# Altium integrated library Altium_WR-USB (rev21a).IntLib: 47 symbols
Pins are listed as number, name and electrical type; pins without a type are passive.

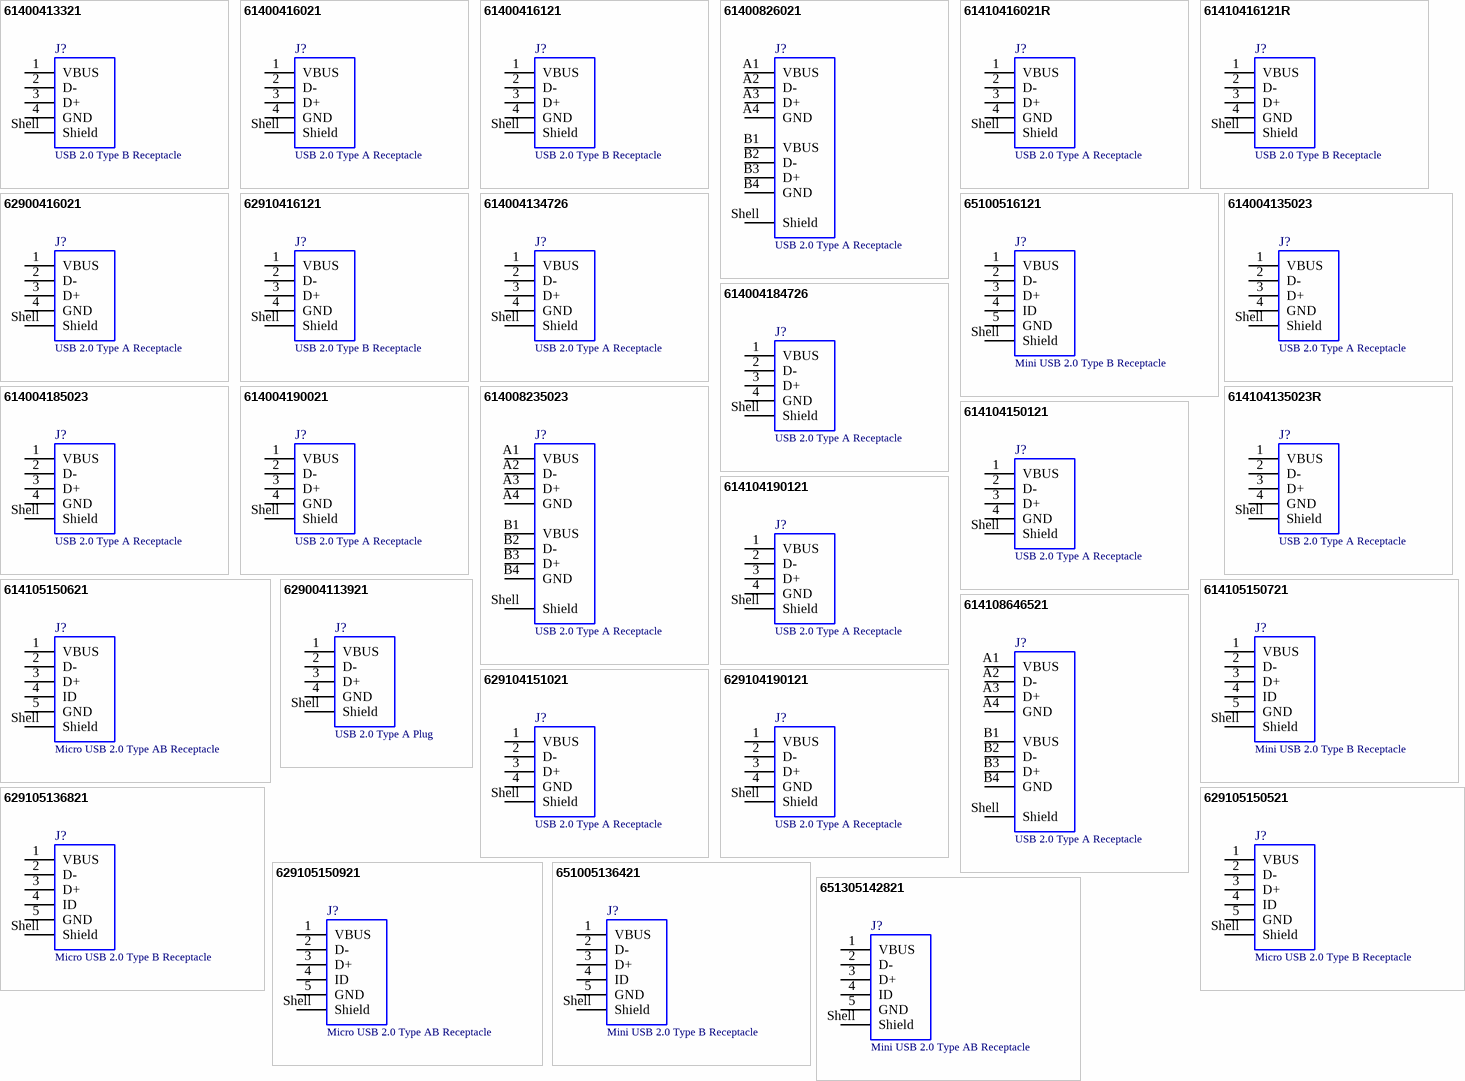
[diagram p0: symbols 61400413321 to 651305142821]

## 61400413321
designator J?, comment USB 2.0 Type B Receptacle
USB 2.0 Type B, Receptacle, Vertical, THT; Manufacturer: Wurth Elektronik; Manufacturer Part Number: 61400413321; Rated Current: 1.5A; Pin Number: 4; Interface Type: Type B; Working Voltage: 30VAC; ComponentLink1Description: Manufacturer; ComponentLink1URL: http://www.we-online.de; ComponentLink2Description: Datasheet; ComponentLink2URL: https://katalog.we-online.com/em/datasheet/61400413321.pdf; Published Date: August 2020; Gender: Receptacle; Type: Vertical; Packaging: Tray; Operating Temperature: -40 to +105degC; Mounting Technology: THT; Application: USB 2.0
footprint 61400413321
pins: 1 VBUS, 2 D-, 3 D+, 4 GND, Shell Shield

## 61400416021
designator J?, comment USB 2.0 Type A Receptacle
USB 2.0 Type A, Receptacle, Horizontal, THT; Manufacturer: Wurth Elektronik; Manufacturer Part Number: 61400416021; Rated Current: 1.5A; Pin Number: 4; Interface Type: Type A; Working Voltage: 30VAC; ComponentLink1Description: Manufacturer; ComponentLink1URL: http://www.we-online.de; ComponentLink2Description: Datasheet; ComponentLink2URL: https://katalog.we-online.com/em/datasheet/61400416021.pdf; Published Date: August 2020; Gender: Receptacle; Type: Horizontal; Packaging: Tray; Operating Temperature: -40 to +105degC; Mounting Technology: THT; Application: USB 2.0
footprint 61400416021
pins: 1 VBUS, 2 D-, 3 D+, 4 GND, Shell Shield

## 61400416121
designator J?, comment USB 2.0 Type B Receptacle
USB 2.0 Type B, Receptacle, Horizontal, THT; Manufacturer: Wurth Elektronik; Manufacturer Part Number: 61400416121; Rated Current: 1.5A; Pin Number: 4; Interface Type: Type B; Working Voltage: 30VAC; ComponentLink1Description: Manufacturer; ComponentLink1URL: http://www.we-online.de; ComponentLink2Description: Datasheet; ComponentLink2URL: https://katalog.we-online.com/em/datasheet/61400416121.pdf; Published Date: August 2020; Gender: Receptacle; Type: Horizontal; Packaging: Tray; Operating Temperature: -40 to +105degC; Mounting Technology: THT; Application: USB 2.0
footprint 61400416121
pins: 1 VBUS, 2 D-, 3 D+, 4 GND, Shell Shield

## 61400826021
designator J?, comment USB 2.0 Type A Receptacle
USB 2.0 Type A, Receptacle, Horizontal, THT, Dual Stacked; Manufacturer: Wurth Elektronik; Manufacturer Part Number: 61400826021; Rated Current: 1.5A; Pin Number: 8; Interface Type: Type A; Working Voltage: 30VAC; ComponentLink1Description: Manufacturer; ComponentLink1URL: http://www.we-online.de; ComponentLink2Description: Datasheet; ComponentLink2URL: https://katalog.we-online.com/em/datasheet/61400826021.pdf; Published Date: August 2020; Gender: Receptacle; Type: Horizontal; Packaging: Tray; Operating Temperature: -40 to +105degC; Mounting Technology: THT; Application: USB 2.0
footprint 61400826021
pins: A1 VBUS, A2 D-, A3 D+, A4 GND, B1 VBUS, B2 D-, B3 D+, B4 GND, Shell Shield

## 61410416021R
designator J?, comment USB 2.0 Type A Receptacle
USB 2.0 Type A, Receptacle, Horizontal, THR; Manufacturer: Wurth Elektronik; Manufacturer Part Number: 61410416021R; Rated Current: 1.5A; Pin Number: 4; Interface Type: Type A; Working Voltage: 30VAC; ComponentLink1Description: Manufacturer; ComponentLink1URL: http://www.we-online.de; ComponentLink2Description: Datasheet; ComponentLink2URL: https://katalog.we-online.com/em/datasheet/61410416021R.pdf; Published Date: August 2020; Gender: Receptacle; Type: Horizontal; Packaging: Tape and Reel; Operating Temperature: -55 to +85degC; Mounting Technology: THR; Application: USB 2.0
footprint 61410416021R
pins: 1 VBUS, 2 D-, 3 D+, 4 GND, Shell Shield

## 61410416121R
designator J?, comment USB 2.0 Type B Receptacle
USB 2.0 Type B, Receptacle, Horizontal, THR; Manufacturer: Wurth Elektronik; Manufacturer Part Number: 61410416121R; Rated Current: 1.5A; Pin Number: 4; Interface Type: Type B; Working Voltage: 30VAC; ComponentLink1Description: Manufacturer; ComponentLink1URL: http://www.we-online.de; ComponentLink2Description: Datasheet; ComponentLink2URL: https://katalog.we-online.com/em/datasheet/61410416121R.pdf; Published Date: August 2020; Gender: Receptacle; Type: Horizontal; Packaging: Tape and Reel; Operating Temperature: -55 to +85degC; Mounting Technology: THR; Application: USB 2.0
footprint 61410416121R
pins: 1 VBUS, 2 D-, 3 D+, 4 GND, Shell Shield

## 62900416021
designator J?, comment USB 2.0 Type A Receptacle
USB 2.0 Type A, Receptacle, Horizontal, SMT; Manufacturer: Wurth Elektronik; Manufacturer Part Number: 62900416021; Rated Current: 1.5A; Pin Number: 4; Interface Type: Type A; Working Voltage: 30VAC; ComponentLink1Description: Manufacturer; ComponentLink1URL: http://www.we-online.de; ComponentLink2Description: Datasheet; ComponentLink2URL: https://katalog.we-online.com/em/datasheet/62900416021.pdf; Published Date: August 2020; Gender: Receptacle; Type: Horizontal; Packaging: Tray; Operating Temperature: -40 to +105degC; Mounting Technology: SMT; Application: USB 2.0
footprint 62900416021
pins: 1 VBUS, 2 D-, 3 D+, 4 GND, Shell Shield

## 62910416121
designator J?, comment USB 2.0 Type B Receptacle
USB 2.0 Type B, Receptacle, Horizontal, SMT; Manufacturer: Wurth Elektronik; Manufacturer Part Number: 62910416121; Rated Current: 1.5A; Pin Number: 4; Interface Type: Type B; Working Voltage: 30VAC; ComponentLink1Description: Manufacturer; ComponentLink1URL: http://www.we-online.de; ComponentLink2Description: Datasheet; ComponentLink2URL: https://katalog.we-online.com/em/datasheet/62910416121.pdf; Published Date: August 2020; Gender: Receptacle; Type: Horizontal; Packaging: Tape and Reel; Operating Temperature: -40 to +105degC; Mounting Technology: SMT; Application: USB 2.0
footprint 62910416121
pins: 1 VBUS, 2 D-, 3 D+, 4 GND, Shell Shield

## 65100516121
designator J?, comment Mini USB 2.0 Type B Receptacle
Mini USB 2.0 Type B, Receptacle, Horizontal, SMT; Manufacturer: Wurth Elektronik; Manufacturer Part Number: 65100516121; Rated Current: 1A; Pin Number: 5; Interface Type: Type B; Working Voltage: 30VAC; ComponentLink1Description: Manufacturer; ComponentLink1URL: http://www.we-online.de; ComponentLink2Description: Datasheet; ComponentLink2URL: https://katalog.we-online.com/em/datasheet/65100516121.pdf; Published Date: August 2020; Gender: Receptacle; Type: Horizontal; Packaging: Tape and Reel; Operating Temperature: -40 to +105degC; Mounting Technology: SMT; Application: Mini USB 2.0
footprint 65100516121
pins: 1 VBUS, 2 D-, 3 D+, 4 ID, 5 GND, Shell Shield

## 614004134726
designator J?, comment USB 2.0 Type A Receptacle
USB 2.0 Type A, Receptacle, Up Right, THT; Manufacturer: Wurth Elektronik; Manufacturer Part Number: 614004134726; Rated Current: 1.5A; Pin Number: 4; Interface Type: Type A; Working Voltage: 30VAC; ComponentLink1Description: Manufacturer; ComponentLink1URL: http://www.we-online.de; ComponentLink2Description: Datasheet; ComponentLink2URL: https://katalog.we-online.com/em/datasheet/614004134726.pdf; Published Date: August 2020; Gender: Receptacle; Type: Up Right; Packaging: Tray; Operating Temperature: -40 to +105degC; Mounting Technology: THT; Application: USB 2.0
footprint 614004134726
pins: 1 VBUS, 2 D-, 3 D+, 4 GND, Shell Shield

## 614004135023
designator J?, comment USB 2.0 Type A Receptacle
USB 2.0 Type A, Receptacle, Vertical, THT; Manufacturer: Wurth Elektronik; Manufacturer Part Number: 614004135023; Rated Current: 1.5A; Pin Number: 4; Interface Type: Type A; Working Voltage: 30VAC; ComponentLink1Description: Manufacturer; ComponentLink1URL: http://www.we-online.de; ComponentLink2Description: Datasheet; ComponentLink2URL: https://katalog.we-online.com/em/datasheet/614004135023.pdf; Published Date: August 2020; Gender: Receptacle; Type: Vertical; Packaging: Tray; Operating Temperature: -40 to +105degC; Mounting Technology: THT; Application: USB 2.0
footprint 614004135023
pins: 1 VBUS, 2 D-, 3 D+, 4 GND, Shell Shield

## 614004184726
designator J?, comment USB 2.0 Type A Receptacle
USB 2.0 Type A, Receptacle, Up Right - Short Type, THT; Manufacturer: Wurth Elektronik; Manufacturer Part Number: 614004184726; Rated Current: 2A; Pin Number: 4; Interface Type: Type A; Working Voltage: 30VAC; ComponentLink1Description: Manufacturer; ComponentLink1URL: http://www.we-online.de; ComponentLink2Description: Datasheet; ComponentLink2URL: https://katalog.we-online.com/em/datasheet/614004184726.pdf; Published Date: August 2020; Gender: Receptacle; Type: Up Right - Short Type; Packaging: Tray; Operating Temperature: -40 to +85degC; Mounting Technology: THT; Application: USB 2.0
footprint 614004184726
pins: 1 VBUS, 2 D-, 3 D+, 4 GND, Shell Shield

## 614004185023
designator J?, comment USB 2.0 Type A Receptacle
USB 2.0 Type A, Receptacle, Vertical - Short Type, THT; Manufacturer: Wurth Elektronik; Manufacturer Part Number: 614004185023; Rated Current: 1.5A; Pin Number: 4; Interface Type: Type A; Working Voltage: 30VAC; ComponentLink1Description: Manufacturer; ComponentLink1URL: http://www.we-online.de; ComponentLink2Description: Datasheet; ComponentLink2URL: https://katalog.we-online.com/em/datasheet/614004185023.pdf; Published Date: August 2020; Gender: Receptacle; Type: Vertical - Short Type; Packaging: Tray; Operating Temperature: -55 to +85degC; Mounting Technology: THT; Application: USB 2.0
footprint 614004185023
pins: 1 VBUS, 2 D-, 3 D+, 4 GND, Shell Shield

## 614004190021
designator J?, comment USB 2.0 Type A Receptacle
USB 2.0 Type A, Receptacle, Horizontal, THT; Manufacturer: Wurth Elektronik; Manufacturer Part Number: 614004190021; Rated Current: 3A; Pin Number: 4; Interface Type: Type A; Working Voltage: 30VAC; ComponentLink1Description: Manufacturer; ComponentLink1URL: http://www.we-online.de; ComponentLink2Description: Datasheet; ComponentLink2URL: https://katalog.we-online.com/em/datasheet/614004190021.pdf; Published Date: August 2020; Gender: Receptacle; Type: Horizontal; Packaging: Tray; Operating Temperature: -40 to +85degC; Mounting Technology: THT; Application: USB 2.0
footprint 614004190021
pins: 1 VBUS, 2 D-, 3 D+, 4 GND, Shell Shield

## 614008235023
designator J?, comment USB 2.0 Type A Receptacle
USB 2.0 Type A, Receptacle, Vertical, THT, Dual Stacked; Manufacturer: Wurth Elektronik; Manufacturer Part Number: 614008235023; Rated Current: 1.5A; Pin Number: 8; Interface Type: Type A; Working Voltage: 30VAC; ComponentLink1Description: Manufacturer; ComponentLink1URL: http://www.we-online.de; ComponentLink2Description: Datasheet; ComponentLink2URL: https://katalog.we-online.com/em/datasheet/614008235023.pdf; Published Date: August 2020; Gender: Receptacle; Type: Vertical; Packaging: Tray; Operating Temperature: -40 to +105degC; Mounting Technology: THT; Application: USB 2.0
footprint 614008235023
pins: A1 VBUS, A2 D-, A3 D+, A4 GND, B1 VBUS, B2 D-, B3 D+, B4 GND, Shell Shield

## 614104135023R
designator J?, comment USB 2.0 Type A Receptacle
USB 2.0 Type A, Receptacle, Vertical, THR; Manufacturer: Wurth Elektronik; Manufacturer Part Number: 614104135023R; Rated Current: 1.5A; Pin Number: 4; Interface Type: Type A; Working Voltage: 30VAC; ComponentLink1Description: Manufacturer; ComponentLink1URL: http://www.we-online.de; ComponentLink2Description: Datasheet; ComponentLink2URL: https://katalog.we-online.com/em/datasheet/614104135023R.pdf; Published Date: August 2020; Gender: Receptacle; Type: Vertical; Packaging: Tape and Reel; Operating Temperature: -55 to +85degC; Mounting Technology: THR; Application: USB 2.0
footprint 614104135023R
pins: 1 VBUS, 2 D-, 3 D+, 4 GND, Shell Shield

## 614104150121
designator J?, comment USB 2.0 Type A Receptacle
USB 2.0 Type A, Receptacle, Horizontal - Short Type, THT; Manufacturer: Wurth Elektronik; Manufacturer Part Number: 614104150121; Rated Current: 1.5A; Pin Number: 4; Interface Type: Type A; Working Voltage: 30VAC; ComponentLink1Description: Manufacturer; ComponentLink1URL: http://www.we-online.de; ComponentLink2Description: Datasheet; ComponentLink2URL: https://katalog.we-online.com/em/datasheet/614104150121.pdf; Published Date: August 2020; Gender: Receptacle; Type: Horizontal - Short Type; Packaging: Tape and Reel; Operating Temperature: -40 to +85degC; Mounting Technology: THT; Application: USB 2.0
footprint 614104150121
pins: 1 VBUS, 2 D-, 3 D+, 4 GND, Shell Shield

## 614104190121
designator J?, comment USB 2.0 Type A Receptacle
USB 2.0 Type A, Receptacle, Horizontal - Short Type, THT; Manufacturer: Wurth Elektronik; Manufacturer Part Number: 614104190121; Rated Current: 1.5A; Pin Number: 4; Interface Type: Type A; Working Voltage: 30VAC; ComponentLink1Description: Manufacturer; ComponentLink1URL: http://www.we-online.de; ComponentLink2Description: Datasheet; ComponentLink2URL: https://katalog.we-online.com/em/datasheet/614104190121.pdf; Published Date: August 2020; Gender: Receptacle; Type: Horizontal - Short Type; Packaging: Tape and Reel; Operating Temperature: -55 to +85degC; Mounting Technology: THT; Application: USB 2.0
footprint 614104190121
pins: 1 VBUS, 2 D-, 3 D+, 4 GND, Shell Shield

## 614105150621
designator J?, comment Micro USB 2.0 Type AB Receptacle
Micro USB 2.0 Type AB, Receptacle, Vertical, THT; Manufacturer: Wurth Elektronik; Manufacturer Part Number: 614105150621; Rated Current: 1.8A; Pin Number: 5; Interface Type: Type AB; Working Voltage: 30VAC; ComponentLink1Description: Manufacturer; ComponentLink1URL: http://www.we-online.de; ComponentLink2Description: Datasheet; ComponentLink2URL: https://katalog.we-online.com/em/datasheet/614105150621.pdf; Published Date: August 2020; Gender: Receptacle; Type: Vertical; Packaging: Tape and Reel; Operating Temperature: -40 to +85degC; Mounting Technology: THT; Application: Micro USB 2.0
footprint 614105150621
pins: 1 VBUS, 2 D-, 3 D+, 4 ID, 5 GND, Shell Shield

## 614105150721
designator J?, comment Mini USB 2.0 Type B Receptacle
Mini USB 2.0 Type B, Receptacle, Vertical, THT; Manufacturer: Wurth Elektronik; Manufacturer Part Number: 614105150721; Rated Current: 1.8A; Pin Number: 5; Interface Type: Type B; Working Voltage: 30VAC; ComponentLink1Description: Manufacturer; ComponentLink1URL: http://www.we-online.de; ComponentLink2Description: Datasheet; ComponentLink2URL: https://katalog.we-online.com/em/datasheet/614105150721.pdf; Published Date: August 2020; Gender: Receptacle; Type: Vertical; Packaging: Tape and Reel; Operating Temperature: -40 to +85degC; Mounting Technology: THT; Application: Mini USB 2.0
footprint 614105150721
pins: 1 VBUS, 2 D-, 3 D+, 4 ID, 5 GND, Shell Shield

## 614108646521
designator J?, comment USB 2.0 Type A Receptacle
USB 2.0 Type A, Receptacle, Horizontal, THR, Dual Stacked; Manufacturer: Wurth Elektronik; Manufacturer Part Number: 614108646521; Rated Current: 2.5A; Pin Number: 8; Interface Type: Type A; Working Voltage: 30VAC; ComponentLink1Description: Manufacturer; ComponentLink1URL: http://www.we-online.de; ComponentLink2Description: Datasheet; ComponentLink2URL: https://katalog.we-online.com/em/datasheet/614108646521.pdf; Published Date: December 2020; Gender: Receptacle; Type: Horizontal; Packaging: Tape and Reel; Operating Temperature: -40 to +85degC; Mounting Technology: THR; Application: USB 2.0
footprint 614108646521 (USB 2.0 Mid-Mount Dual Port)
pins: A1 VBUS, A2 D-, A3 D+, A4 GND, B1 VBUS, B2 D-, B3 D+, B4 GND, Shell Shield

## 629004113921
designator J?, comment USB 2.0 Type A Plug
USB 2.0 Type A, Plug, Horizontal, SMT, with Clip; Manufacturer: Wurth Elektronik; Manufacturer Part Number: 629004113921; Rated Current: 1.5A; Pin Number: 4; Interface Type: Type A; Working Voltage: 30VAC; ComponentLink1Description: Manufacturer; ComponentLink1URL: http://www.we-online.de; ComponentLink2Description: Datasheet; ComponentLink2URL: https://katalog.we-online.com/em/datasheet/629004113921.pdf; Published Date: August 2020; Gender: Plug; Type: Horizontal; Packaging: Tube; Operating Temperature: -40 to +105degC; Mounting Technology: SMT; Application: USB 2.0
footprint 629004113921
pins: 1 VBUS, 2 D-, 3 D+, 4 GND, Shell Shield

## 629104151021
designator J?, comment USB 2.0 Type A Receptacle
USB 2.0 Type A, Receptacle, Horizontal, SMT, with Pegs; Manufacturer: Wurth Elektronik; Manufacturer Part Number: 629104151021; Rated Current: 1.5A; Pin Number: 4; Interface Type: Type A; Working Voltage: 30VAC; ComponentLink1Description: Manufacturer; ComponentLink1URL: http://www.we-online.de; ComponentLink2Description: Datasheet; ComponentLink2URL: https://katalog.we-online.com/em/datasheet/629104151021.pdf; Published Date: August 2020; Gender: Receptacle; Type: Horizontal; Packaging: Tape and Reel; Operating Temperature: -40 to +85degC; Mounting Technology: SMT; Application: USB 2.0
footprint 629104151021
pins: 1 VBUS, 2 D-, 3 D+, 4 GND, Shell Shield

## 629104190121
designator J?, comment USB 2.0 Type A Receptacle
USB 2.0 Type A, Receptacle, Horizontal - Short Type, SMT; Manufacturer: Wurth Elektronik; Manufacturer Part Number: 629104190121; Rated Current: 1.5A; Pin Number: 4; Interface Type: Type A; Working Voltage: 30VAC; ComponentLink1Description: Manufacturer; ComponentLink1URL: http://www.we-online.de; ComponentLink2Description: Datasheet; ComponentLink2URL: https://katalog.we-online.com/em/datasheet/629104190121.pdf; Published Date: August 2020; Gender: Receptacle; Type: Horizontal - Short Type; Packaging: Tape and Reel; Operating Temperature: -40 to +85degC; Mounting Technology: SMT; Application: USB 2.0
footprint 629104190121
pins: 1 VBUS, 2 D-, 3 D+, 4 GND, Shell Shield

## 629105136821
designator J?, comment Micro USB 2.0 Type B Receptacle
Micro USB 2.0 Type B, Receptacle, Horizontal, SMT; Manufacturer: Wurth Elektronik; Manufacturer Part Number: 629105136821; Rated Current: 1A; Pin Number: 5; Interface Type: Type B; Working Voltage: 30VAC; ComponentLink1Description: Manufacturer; ComponentLink1URL: http://www.we-online.de; ComponentLink2Description: Datasheet; ComponentLink2URL: https://katalog.we-online.com/em/datasheet/629105136821.pdf; Published Date: August 2020; Gender: Receptacle; Type: Horizontal; Packaging: Tape and Reel; Operating Temperature: -40 to +105degC; Mounting Technology: SMT; Application: Micro USB 2.0
footprint 629105136821
pins: 1 VBUS, 2 D-, 3 D+, 4 ID, 5 GND, Shell Shield

## 629105150521
designator J?, comment Micro USB 2.0 Type B Receptacle
Micro USB 2.0 Type B, Receptacle, Horizontal, SMT, with Pegs; Manufacturer: Wurth Elektronik; Manufacturer Part Number: 629105150521; Rated Current: 3A; Pin Number: 5; Interface Type: Type B; Working Voltage: 30VAC; ComponentLink1Description: Manufacturer; ComponentLink1URL: http://www.we-online.de; ComponentLink2Description: Datasheet; ComponentLink2URL: https://katalog.we-online.com/em/datasheet/629105150521.pdf; Published Date: August 2020; Gender: Receptacle; Type: Horizontal; Packaging: Tape and Reel; Operating Temperature: -40 to +85degC; Mounting Technology: SMT; Application: Micro USB 2.0
footprint 629105150521
pins: 1 VBUS, 2 D-, 3 D+, 4 ID, 5 GND, Shell Shield

## 629105150921
designator J?, comment Micro USB 2.0 Type AB Receptacle
Micro USB 2.0 Type AB, Receptacle, Horizontal, SMT; Manufacturer: Wurth Elektronik; Manufacturer Part Number: 629105150921; Rated Current: 1.8A; Pin Number: 5; Interface Type: Type AB; Working Voltage: 30VAC; ComponentLink1Description: Manufacturer; ComponentLink1URL: http://www.we-online.de; ComponentLink2Description: Datasheet; ComponentLink2URL: https://katalog.we-online.com/em/datasheet/629105150921.pdf; Published Date: August 2020; Gender: Receptacle; Type: Horizontal; Packaging: Tape and Reel; Operating Temperature: -40 to +85degC; Mounting Technology: SMT; Application: Micro USB 2.0
footprint 629105150921
pins: 1 VBUS, 2 D-, 3 D+, 4 ID, 5 GND, Shell Shield

## 651005136421
designator J?, comment Mini USB 2.0 Type B Receptacle
Mini USB 2.0 Type B, Receptacle, Vertical, THT; Manufacturer: Wurth Elektronik; Manufacturer Part Number: 651005136421; Rated Current: 1A; Pin Number: 5; Interface Type: Type B; Working Voltage: 30VAC; ComponentLink1Description: Manufacturer; ComponentLink1URL: http://www.we-online.de; ComponentLink2Description: Datasheet; ComponentLink2URL: https://katalog.we-online.com/em/datasheet/651005136421.pdf; Published Date: August 2020; Gender: Receptacle; Type: Vertical; Packaging: Tray; Operating Temperature: -40 to +105degC; Mounting Technology: THT; Application: Mini USB 2.0
footprint 651005136421
pins: 1 VBUS, 2 D-, 3 D+, 4 ID, 5 GND, Shell Shield

## 651305142821
designator J?, comment Mini USB 2.0 Type AB Receptacle
Mini USB 2.0 Type AB, Receptacle, Horizontal, SMT; Manufacturer: Wurth Elektronik; Manufacturer Part Number: 651305142821; Rated Current: 1A; Pin Number: 5; Interface Type: Type AB; Working Voltage: 30VAC; ComponentLink1Description: Manufacturer; ComponentLink1URL: http://www.we-online.de; ComponentLink2Description: Datasheet; ComponentLink2URL: https://katalog.we-online.com/em/datasheet/651305142821.pdf; Published Date: August 2020; Gender: Receptacle; Type: Horizontal; Packaging: Tape and Reel; Operating Temperature: -40 to +105degC; Mounting Technology: SMT; Application: Mini USB 2.0
footprint 651305142821
pins: 1 VBUS, 2 D-, 3 D+, 4 ID, 5 GND, Shell Shield


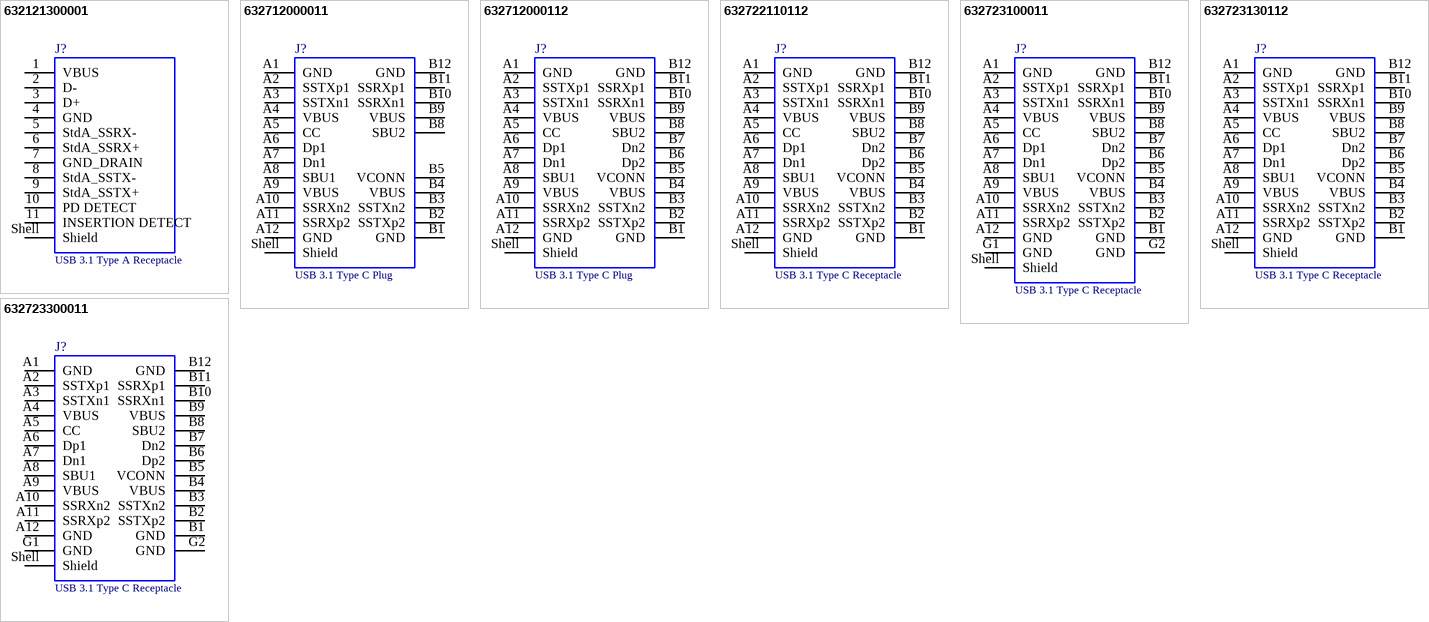
[diagram p1: symbols 632121300001 to 632723300011]

## 632121300001
designator J?, comment USB 3.1 Type A Receptacle
USB 3.1 Type A, Receptacle, Horizontal, THR; Manufacturer: Wurth Elektronik; Manufacturer Part Number: 632121300001; Rated Current: 5A; Pin Number: 9; Interface Type: Type A; Working Voltage: 20VAC; ComponentLink1Description: Manufacturer; ComponentLink1URL: http://www.we-online.de; ComponentLink2Description: Datasheet; ComponentLink2URL: https://katalog.we-online.com/em/datasheet/632121300001.pdf; Published Date: August 2020; Gender: Receptacle; Type: Horizontal; Packaging: Tray; Operating Temperature: -20 to +85degC; Mounting Technology: THR; Application: USB 3.1
footprint 632121300001
pins: 1 VBUS, 2 D-, 3 D+, 4 GND, 5 StdA_SSRX-, 6 StdA_SSRX+, 7 GND_DRAIN, 8 StdA_SSTX-, 9 StdA_SSTX+, 10 PD DETECT, 11 INSERTION DETECT, Shell Shield

## 632712000011
designator J?, comment USB 3.1 Type C Plug
USB 3.1 Type C, Plug, Horizontal, SMT; Manufacturer: Wurth Elektronik; Manufacturer Part Number: 632712000011; Rated Current: 5A; Pin Number: 22; Interface Type: Type C; Working Voltage: 20VAC; ComponentLink1Description: Manufacturer; ComponentLink1URL: http://www.we-online.de; ComponentLink2Description: Datasheet; ComponentLink2URL: https://katalog.we-online.com/em/datasheet/632712000011.pdf; Published Date: August 2020; Gender: Plug; Type: Horizontal; Packaging: Tape and Reel; Operating Temperature: -25 to +105degC; Mounting Technology: SMT; Application: USB 3.1
footprint 632712000011
pins: A1 GND, A2 SSTXp1, A3 SSTXn1, A4 VBUS, A5 CC, A6 Dp1, A7 Dn1, A8 SBU1, A9 VBUS, A10 SSRXn2, A11 SSRXp2, A12 GND, B1 GND, B2 SSTXp2, B3 SSTXn2, B4 VBUS, B5 VCONN, B8 SBU2, B9 VBUS, B10 SSRXn1, B11 SSRXp1, B12 GND, Shell Shield

## 632712000112
designator J?, comment USB 3.1 Type C Plug
USB 3.1 Type C, Plug, Horizontal, SMT; Manufacturer: Wurth Elektronik; Manufacturer Part Number: 632712000112; Rated Current: 5A; Pin Number: 24; Interface Type: Type C; Working Voltage: 20VAC; ComponentLink1Description: Manufacturer; ComponentLink1URL: http://www.we-online.de; ComponentLink2Description: Datasheet; ComponentLink2URL: https://katalog.we-online.com/em/datasheet/632712000112.pdf; Published Date: August 2020; Gender: Plug; Type: Horizontal; Packaging: Tray; Operating Temperature: -40 to +85degC; Mounting Technology: SMT; Application: USB 3.1
footprint 632712000112
pins: A1 GND, A2 SSTXp1, A3 SSTXn1, A4 VBUS, A5 CC, A6 Dp1, A7 Dn1, A8 SBU1, A9 VBUS, A10 SSRXn2, A11 SSRXp2, A12 GND, B1 GND, B2 SSTXp2, B3 SSTXn2, B4 VBUS, B5 VCONN, B6 Dp2, B7 Dn2, B8 SBU2, B9 VBUS, B10 SSRXn1, B11 SSRXp1, B12 GND, Shell Shield

## 632722110112
designator J?, comment USB 3.1 Type C Receptacle
USB 3.1 Type C, Receptacle, Vertical, SMT; Manufacturer: Wurth Elektronik; Manufacturer Part Number: 632722110112; Rated Current: 5A; Pin Number: 24; Interface Type: Type C; Working Voltage: 20VAC; ComponentLink1Description: Manufacturer; ComponentLink1URL: http://www.we-online.de; ComponentLink2Description: Datasheet; ComponentLink2URL: https://katalog.we-online.com/em/datasheet/632722110112.pdf; Published Date: August 2020; Gender: Receptacle; Type: Vertical; Packaging: Tape and Reel; Operating Temperature: -40 to +85degC; Mounting Technology: SMT; Application: USB 3.1
footprint 632722110112
pins: A1 GND, A2 SSTXp1, A3 SSTXn1, A4 VBUS, A5 CC, A6 Dp1, A7 Dn1, A8 SBU1, A9 VBUS, A10 SSRXn2, A11 SSRXp2, A12 GND, B1 GND, B2 SSTXp2, B3 SSTXn2, B4 VBUS, B5 VCONN, B6 Dp2, B7 Dn2, B8 SBU2, B9 VBUS, B10 SSRXn1, B11 SSRXp1, B12 GND, Shell Shield

## 632723100011
designator J?, comment USB 3.1 Type C Receptacle
USB 3.1 Type C, Receptacle, Horizontal, THR; Manufacturer: Wurth Elektronik; Manufacturer Part Number: 632723100011; Rated Current: 5A; Pin Number: 24; Interface Type: Type C; Working Voltage: 20VAC; ComponentLink1Description: Manufacturer; ComponentLink1URL: http://www.we-online.de; ComponentLink2Description: Datasheet; ComponentLink2URL: https://katalog.we-online.com/em/datasheet/632723100011.pdf; Published Date: August 2020; Gender: Receptacle; Type: Horizontal; Packaging: Tape and Reel; Operating Temperature: -40 to +105degC; Mounting Technology: THR; Application: USB 3.1
footprint 632723100011
pins: A1 GND, A2 SSTXp1, A3 SSTXn1, A4 VBUS, A5 CC, A6 Dp1, A7 Dn1, A8 SBU1, A9 VBUS, A10 SSRXn2, A11 SSRXp2, A12 GND, B1 GND, B2 SSTXp2, B3 SSTXn2, B4 VBUS, B5 VCONN, B6 Dp2, B7 Dn2, B8 SBU2, B9 VBUS, B10 SSRXn1, B11 SSRXp1, B12 GND, G1 GND, G2 GND, Shell Shield

## 632723130112
designator J?, comment USB 3.1 Type C Receptacle
USB 3.1 Type C, Receptacle, Horizontal, THR; Manufacturer: Wurth Elektronik; Manufacturer Part Number: 632723130112; Rated Current: 5A; Pin Number: 24; Interface Type: Type C; Working Voltage: 20VAC; ComponentLink1Description: Manufacturer; ComponentLink1URL: http://www.we-online.de; ComponentLink2Description: Datasheet; ComponentLink2URL: https://katalog.we-online.com/em/datasheet/632723130112.pdf; Published Date: August 2020; Gender: Receptacle; Type: Horizontal; Packaging: Tape and Reel; Operating Temperature: -40 to +85degC; Mounting Technology: THR; Application: USB 3.1
footprint 632723130112
pins: A1 GND, A2 SSTXp1, A3 SSTXn1, A4 VBUS, A5 CC, A6 Dp1, A7 Dn1, A8 SBU1, A9 VBUS, A10 SSRXn2, A11 SSRXp2, A12 GND, B1 GND, B2 SSTXp2, B3 SSTXn2, B4 VBUS, B5 VCONN, B6 Dp2, B7 Dn2, B8 SBU2, B9 VBUS, B10 SSRXn1, B11 SSRXp1, B12 GND, Shell Shield

## 632723300011
designator J?, comment USB 3.1 Type C Receptacle
USB 3.1 Type C, Receptacle, Horizontal, THR; Manufacturer: Wurth Elektronik; Manufacturer Part Number: 632723300011; Rated Current: 5A; Pin Number: 24; Interface Type: Type C; Working Voltage: 20VAC; ComponentLink1Description: Manufacturer; ComponentLink1URL: http://www.we-online.de; ComponentLink2Description: Datasheet; ComponentLink2URL: https://katalog.we-online.com/em/datasheet/632723300011.pdf; Published Date: August 2020; Gender: Receptacle; Type: Horizontal; Packaging: Tape and Reel; Operating Temperature: -40 to +105degC; Mounting Technology: THR; Application: USB 3.1
footprint 632723300011
pins: A1 GND, A2 SSTXp1, A3 SSTXn1, A4 VBUS, A5 CC, A6 Dp1, A7 Dn1, A8 SBU1, A9 VBUS, A10 SSRXn2, A11 SSRXp2, A12 GND, B1 GND, B2 SSTXp2, B3 SSTXn2, B4 VBUS, B5 VCONN, B6 Dp2, B7 Dn2, B8 SBU2, B9 VBUS, B10 SSRXn1, B11 SSRXp1, B12 GND, G1 GND, G2 GND, Shell Shield


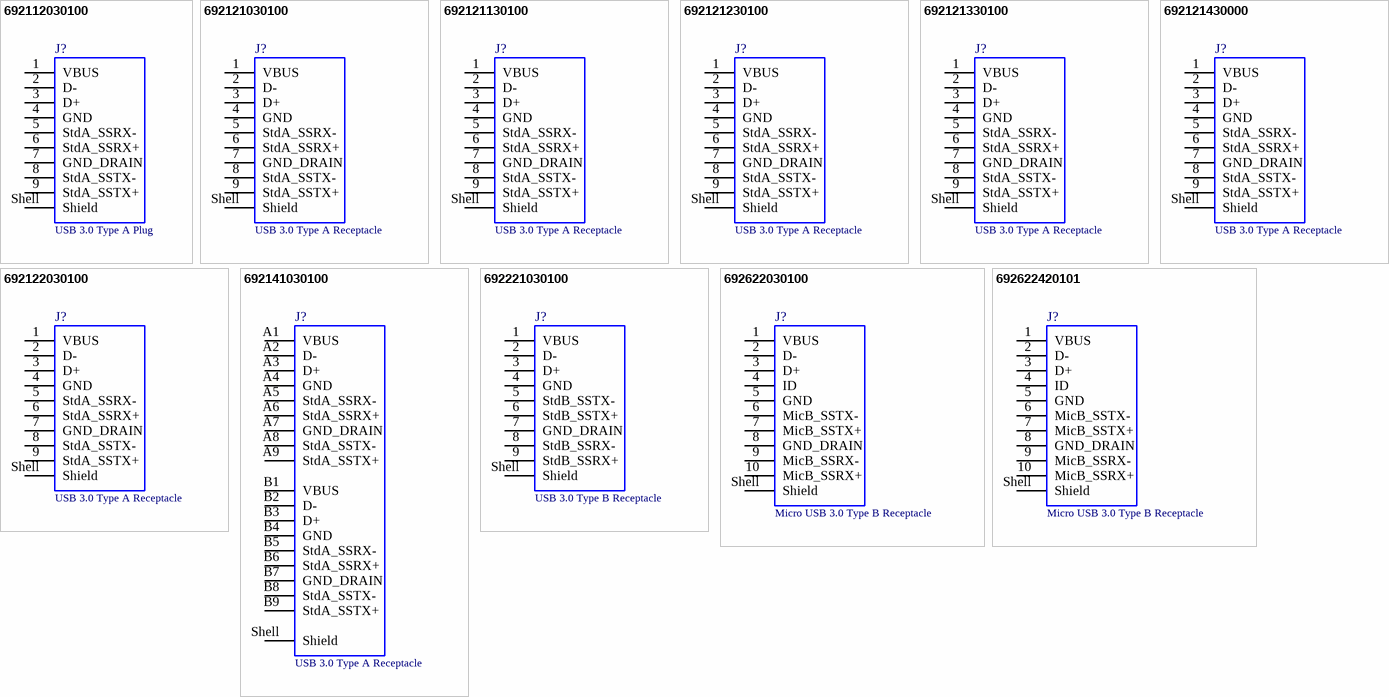
[diagram p2: symbols 692112030100 to 692622420101]

## 692112030100
designator J?, comment USB 3.0 Type A Plug
USB 3.0 Type A, Plug, Horizontal, SMT; Manufacturer: Wurth Elektronik; Manufacturer Part Number: 692112030100; Rated Current: 1.8A; Pin Number: 9; Interface Type: Type A; Working Voltage: 30VAC; ComponentLink1Description: Manufacturer; ComponentLink1URL: http://www.we-online.de; ComponentLink2Description: Datasheet; ComponentLink2URL: https://katalog.we-online.com/em/datasheet/692112030100.pdf; Published Date: August 2020; Gender: Plug; Type: Horizontal; Packaging: Tray; Operating Temperature: -20 to +85degC; Mounting Technology: SMT; Application: USB 3.0
footprint 692112030100
pins: 1 VBUS, 2 D-, 3 D+, 4 GND, 5 StdA_SSRX-, 6 StdA_SSRX+, 7 GND_DRAIN, 8 StdA_SSTX-, 9 StdA_SSTX+, Shell Shield

## 692121030100
designator J?, comment USB 3.0 Type A Receptacle
USB 3.0 Type A, Receptacle, Horizontal, THT; Manufacturer: Wurth Elektronik; Manufacturer Part Number: 692121030100; Rated Current: 1.8A; Pin Number: 9; Interface Type: Type A; Working Voltage: 30VAC; ComponentLink1Description: Manufacturer; ComponentLink1URL: http://www.we-online.de; ComponentLink2Description: Datasheet; ComponentLink2URL: https://katalog.we-online.com/em/datasheet/692121030100.pdf; Published Date: August 2020; Gender: Receptacle; Type: Horizontal; Packaging: Tape and Reel; Operating Temperature: -20 to +85degC; Mounting Technology: THT; Application: USB 3.0
footprint 692121030100
pins: 1 VBUS, 2 D-, 3 D+, 4 GND, 5 StdA_SSRX-, 6 StdA_SSRX+, 7 GND_DRAIN, 8 StdA_SSTX-, 9 StdA_SSTX+, Shell Shield

## 692121130100
designator J?, comment USB 3.0 Type A Receptacle
USB 3.0 Type A, Receptacle, Reverse Horizontal, THR, with Offset 0.14mm; Manufacturer: Wurth Elektronik; Manufacturer Part Number: 692121130100; Rated Current: 1.8A; Pin Number: 9; Interface Type: Type A; Working Voltage: 30VAC; ComponentLink1Description: Manufacturer; ComponentLink1URL: http://www.we-online.de; ComponentLink2Description: Datasheet; ComponentLink2URL: https://katalog.we-online.com/em/datasheet/692121130100.pdf; Published Date: August 2020; Gender: Receptacle; Type: Reverse Horizontal; Packaging: Tape and Reel; Operating Temperature: -20 to +85degC; Mounting Technology: THR; Application: USB 3.0
footprint 692121130100
pins: 1 VBUS, 2 D-, 3 D+, 4 GND, 5 StdA_SSRX-, 6 StdA_SSRX+, 7 GND_DRAIN, 8 StdA_SSTX-, 9 StdA_SSTX+, Shell Shield

## 692121230100
designator J?, comment USB 3.0 Type A Receptacle
USB 3.0 Type A, Receptacle, Horizontal, THR, with Offset 1.04mm; Manufacturer: Wurth Elektronik; Manufacturer Part Number: 692121230100; Rated Current: 1.8A; Pin Number: 9; Interface Type: Type A; Working Voltage: 30VAC; ComponentLink1Description: Manufacturer; ComponentLink1URL: http://www.we-online.de; ComponentLink2Description: Datasheet; ComponentLink2URL: https://katalog.we-online.com/em/datasheet/692121230100.pdf; Published Date: August 2020; Gender: Receptacle; Type: Horizontal; Packaging: Tape and Reel; Operating Temperature: -20 to +85degC; Mounting Technology: THR; Application: USB 3.0
footprint 692121230100
pins: 1 VBUS, 2 D-, 3 D+, 4 GND, 5 StdA_SSRX-, 6 StdA_SSRX+, 7 GND_DRAIN, 8 StdA_SSTX-, 9 StdA_SSTX+, Shell Shield

## 692121330100
designator J?, comment USB 3.0 Type A Receptacle
USB 3.0 Type A, Receptacle, Reverse Horizontal, THR, with Offset 1.75mm; Manufacturer: Wurth Elektronik; Manufacturer Part Number: 692121330100; Rated Current: 1.8A; Pin Number: 9; Interface Type: Type A; Working Voltage: 30VAC; ComponentLink1Description: Manufacturer; ComponentLink1URL: http://www.we-online.de; ComponentLink2Description: Datasheet; ComponentLink2URL: https://katalog.we-online.com/em/datasheet/692121330100.pdf; Published Date: August 2020; Gender: Receptacle; Type: Reverse Horizontal; Packaging: Tape and Reel; Operating Temperature: -20 to +85degC; Mounting Technology: THR; Application: USB 3.0
footprint 692121330100
pins: 1 VBUS, 2 D-, 3 D+, 4 GND, 5 StdA_SSRX-, 6 StdA_SSRX+, 7 GND_DRAIN, 8 StdA_SSTX-, 9 StdA_SSTX+, Shell Shield

## 692121430000
designator J?, comment USB 3.0 Type A Receptacle
USB 3.0 Type A, Receptacle, Vertical, THT; Manufacturer: Wurth Elektronik; Manufacturer Part Number: 692121430000; Rated Current: 1.8A; Pin Number: 9; Interface Type: Type A; Working Voltage: 30VAC; ComponentLink1Description: Manufacturer; ComponentLink1URL: http://www.we-online.de; ComponentLink2Description: Datasheet; ComponentLink2URL: https://katalog.we-online.com/em/datasheet/692121430000.pdf; Published Date: August 2020; Gender: Receptacle; Type: Vertical; Packaging: Tray; Operating Temperature: -20 to +85degC; Mounting Technology: THT; Application: USB 3.0
footprint 692121430000
pins: 1 VBUS, 2 D-, 3 D+, 4 GND, 5 StdA_SSRX-, 6 StdA_SSRX+, 7 GND_DRAIN, 8 StdA_SSTX-, 9 StdA_SSTX+, Shell Shield

## 692122030100
designator J?, comment USB 3.0 Type A Receptacle
USB 3.0 Type A, Receptacle, Horizontal, SMT; Manufacturer: Wurth Elektronik; Manufacturer Part Number: 692122030100; Rated Current: 1.8A; Pin Number: 9; Interface Type: Type A; Working Voltage: 30VAC; ComponentLink1Description: Manufacturer; ComponentLink1URL: http://www.we-online.de; ComponentLink2Description: Datasheet; ComponentLink2URL: https://katalog.we-online.com/em/datasheet/692122030100.pdf; Published Date: August 2020; Gender: Receptacle; Type: Horizontal; Packaging: Tape and Reel; Operating Temperature: -20 to +85degC; Mounting Technology: SMT; Application: USB 3.0
footprint 692122030100
pins: 1 VBUS, 2 D-, 3 D+, 4 GND, 5 StdA_SSRX-, 6 StdA_SSRX+, 7 GND_DRAIN, 8 StdA_SSTX-, 9 StdA_SSTX+, Shell Shield

## 692141030100
designator J?, comment USB 3.0 Type A Receptacle
USB 3.0 Type A, Receptacle, Horizontal, THR, Dual Stacked; Manufacturer: Wurth Elektronik; Manufacturer Part Number: 692141030100; Rated Current: 1.8A; Pin Number: 18; Interface Type: Type A; Working Voltage: 30VAC; ComponentLink1Description: Manufacturer; ComponentLink1URL: http://www.we-online.de; ComponentLink2Description: Datasheet; ComponentLink2URL: https://katalog.we-online.com/em/datasheet/692141030100.pdf; Published Date: August 2020; Gender: Receptacle; Type: Horizontal; Packaging: Tray; Operating Temperature: -40 to +85degC; Mounting Technology: THR; Application: USB 3.0
footprint 692141030100
pins: A1 VBUS, A2 D-, A3 D+, A4 GND, A5 StdA_SSRX-, A6 StdA_SSRX+, A7 GND_DRAIN, A8 StdA_SSTX-, A9 StdA_SSTX+, B1 VBUS, B2 D-, B3 D+, B4 GND, B5 StdA_SSRX-, B6 StdA_SSRX+, B7 GND_DRAIN, B8 StdA_SSTX-, B9 StdA_SSTX+, Shell Shield

## 692221030100
designator J?, comment USB 3.0 Type B Receptacle
USB 3.0 Type B, Receptacle, Horizontal, THT; Manufacturer: Wurth Elektronik; Manufacturer Part Number: 692221030100; Rated Current: 1.8A; Pin Number: 9; Interface Type: Type B; Working Voltage: 30VAC; ComponentLink1Description: Manufacturer; ComponentLink1URL: http://www.we-online.de; ComponentLink2Description: Datasheet; ComponentLink2URL: https://katalog.we-online.com/em/datasheet/692221030100.pdf; Published Date: August 2020; Gender: Receptacle; Type: Horizontal; Packaging: Tray; Operating Temperature: -20 to +85degC; Mounting Technology: THT; Application: USB 3.0
footprint 692221030100
pins: 1 VBUS, 2 D-, 3 D+, 4 GND, 5 StdB_SSTX-, 6 StdB_SSTX+, 7 GND_DRAIN, 8 StdB_SSRX-, 9 StdB_SSRX+, Shell Shield

## 692622030100
designator J?, comment Micro USB 3.0 Type B Receptacle
Micro USB 3.0 Type B, Receptacle, Horizontal, SMT; Manufacturer: Wurth Elektronik; Manufacturer Part Number: 692622030100; Rated Current: 1.8A; Pin Number: 10; Interface Type: Type B; Working Voltage: 30VAC; ComponentLink1Description: Manufacturer; ComponentLink1URL: http://www.we-online.de; ComponentLink2Description: Datasheet; ComponentLink2URL: https://katalog.we-online.com/em/datasheet/692622030100.pdf; Published Date: August 2020; Gender: Receptacle; Type: Horizontal; Packaging: Tape and Reel; Operating Temperature: -20 to +85degC; Mounting Technology: SMT; Application: Micro USB 3.0
footprint 692622030100
pins: 1 VBUS, 2 D-, 3 D+, 4 ID, 5 GND, 6 MicB_SSTX-, 7 MicB_SSTX+, 8 GND_DRAIN, 9 MicB_SSRX-, 10 MicB_SSRX+, Shell Shield

## 692622420101
designator J?, comment Micro USB 3.0 Type B Receptacle
Micro USB 3.0 Type B, Receptacle, Vertical, SMT; Manufacturer: Wurth Elektronik; Manufacturer Part Number: 692622420101; Rated Current: 1.8A; Pin Number: 10; Interface Type: Type B; Working Voltage: 30VAC; ComponentLink1Description: Manufacturer; ComponentLink1URL: http://www.we-online.de; ComponentLink2Description: Datasheet; ComponentLink2URL: https://katalog.we-online.com/em/datasheet/692622420101.pdf; Published Date: August 2020; Gender: Receptacle; Type: Vertical; Packaging: Tape and Reel; Operating Temperature: -30 to +85degC; Mounting Technology: SMT; Application: Micro USB 3.0
footprint 692622420101
pins: 1 VBUS, 2 D-, 3 D+, 4 ID, 5 GND, 6 MicB_SSTX-, 7 MicB_SSTX+, 8 GND_DRAIN, 9 MicB_SSRX-, 10 MicB_SSRX+, Shell Shield